# Altium footprint library BaseBoard.PcbLib: 128 footprints (part 3 of 8)
Each footprint in its own frame and in the unit in brackets; x right, y up, seen from the top. Pads: shape width x height; smd on the part's side, far side on the other; paste and mask are expansions set on the pad; w line width, h text height; cw(c..) or ccw(c..) is an arc to the next point about the centre after c.
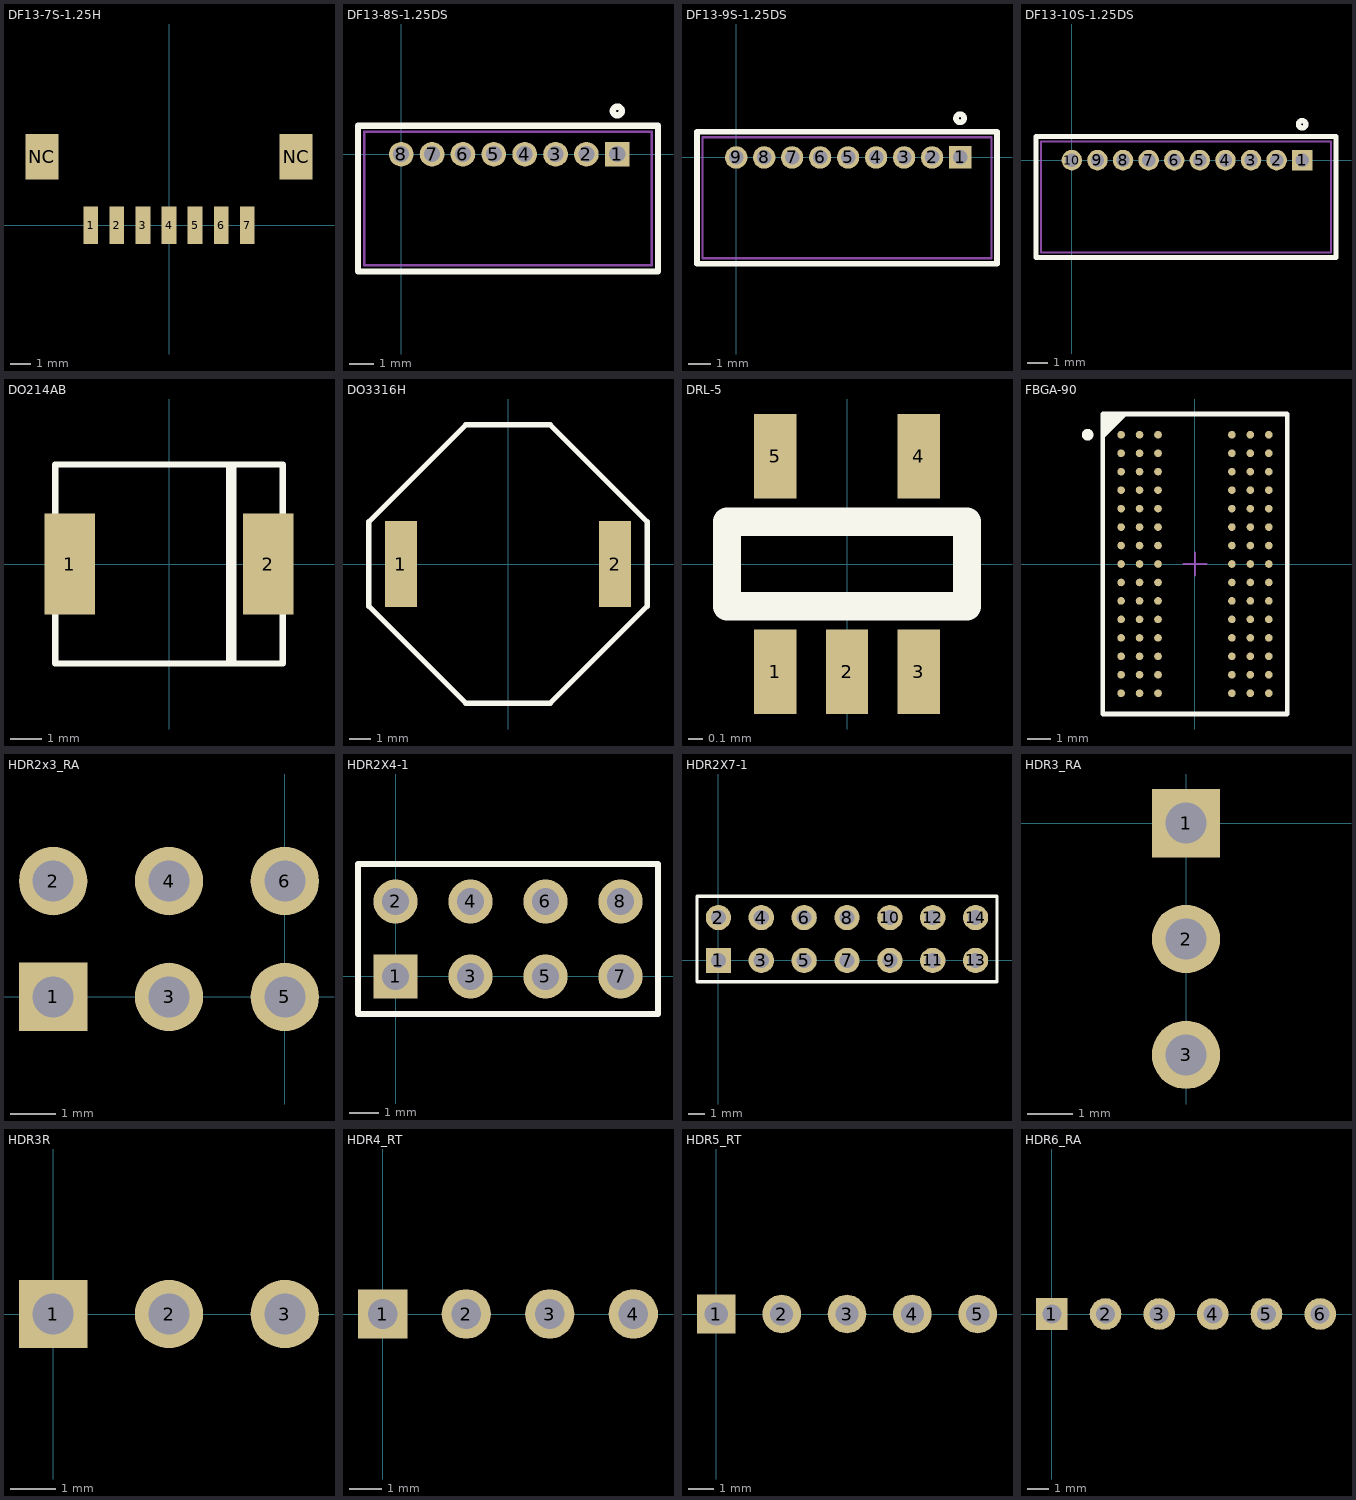
[diagram p2: the footprints below, top view; thin cyan lines are the x and y axes]

## DF13-7S-1.25H [mm] "Hirose Right handle SMD 7pin"
pads (9):
  rect 0.7x1.8 smd: 1(-3.75,0) 2(-2.5,0) 3(-1.25,0) 4(0,0) 5(1.25,0) 6(2.5,0) 7(3.75,0)
  rect 1.6x2.2 smd: NC(-6.1,3.3) NC(6.1,3.3)
3D body "DF13A-7P-1.25H.stp": height 3.58, standoff -0.02, extent -6.7,-0.5 6.7,6

## DF13-8S-1.25DS [mm] "DF13, 8 pin through hole, 1.25 mm"
pads (8):
  rect 1x1 hole 0.65: 1(8.75,0)
  round 1 hole 0.65: 2(7.5,0) 3(6.25,0) 4(5,0) 5(3.75,0) 6(2.5,0) 7(1.25,0) 8(0,0)
Top Overlay:
  circle w0.254: c8.75,1.75 r0.18
  lines w0.254: -1.75,-4.75 -1.75,1.15 10.4,1.15 10.4,-4.75 -1.75,-4.75
Mechanical 13:
  lines w0.1: -1.5,-4.5 10.15,-4.5 10.15,0.9 -1.5,0.9 -1.5,-4.5
3D body: height 3.6, standoff 0, extent -1.55,-4.55 10.2,0.95

## DF13-9S-1.25DS [mm] "DF13, 9pin through hole, 1.25mm"
pads (9):
  rect 1x1 hole 0.65: 1(10,0)
  round 1 hole 0.65: 2(8.75,0) 3(7.5,0) 4(6.25,0) 5(5,0) 6(3.75,0) 7(2.5,0) 8(1.25,0) 9(0,0)
Top Overlay:
  circle w0.254: c10,1.75 r0.18
  lines w0.254: -1.75,-4.75 -1.75,1.15 11.65,1.15 11.65,-4.75 -1.75,-4.75
Mechanical 13:
  lines w0.1: -1.5,-4.5 11.4,-4.5 11.4,0.9 -1.5,0.9 -1.5,-4.5
3D body: height 3.6, standoff 0, extent -1.55,-4.55 11.45,0.95

## DF13-10S-1.25DS [mm] "DF13, 10 pin through hole, right angle"
height 3.6
pads (10):
  rect 1x1 hole 0.65: 1(11.25,0)
  round 1 hole 0.65: 2(10,0) 3(8.75,0) 4(7.5,0) 5(6.25,0) 6(5,0) 7(3.75,0) 8(2.5,0) 9(1.25,0) 10(0,0)
Top Overlay:
  circle w0.254: c11.25,1.75 r0.18
  lines w0.254: -1.75,-4.75 12.9,-4.75 12.9,1.15 -1.75,1.15 -1.75,-4.75
Mechanical 13:
  lines w0.1: -1.5,-4.5 -1.5,0.9 12.65,0.9 12.65,-4.5 -1.5,-4.5
3D body: height 3.6, standoff 0, extent -1.55,-4.55 12.7,0.95

## DO214AB [mm]
height 2.65
pads (2):
  rect 1.6x3.2 smd: 1(-3.15,0) 2(3.15,0)
Top Overlay:
  lines w0.2: 1.905,-3.15 1.905,3.15 ; 2.032,-3.15 2.032,3.15 ; -3.6,-3.15 -3.6,3.15 3.6,3.15 3.6,-3.15 -3.6,-3.15

## DO3316H [mm] "Inductor for power"
pads (2):
  rect 1.52x4.06 smd: 1(-5.08,0) 2(5.08,0)
Top Overlay:
  lines w0.254: -1.9,-6.6 -1.6,-6.6 ; 1.397,-6.6 1.9,-6.6 ; 1.9,6.6 1.6,6.6 ; -1.6,-6.6 -2,-6.6 -6.6,-2 -6.6,2 -2,6.6 -1.9,6.6 -1.6,6.6 1.6,6.6 ; -1.6,-6.6 1.6,-6.6 2,-6.6 6.6,-2 6.6,2 2,6.6 1.6,6.6

## DRL-5 [mm]
pads (5):
  rect 0.3x0.6 smd mask+0.11: 1(-0.508,-0.762) 2(0,-0.762) 3(0.508,-0.762) 4(0.508,0.762) 5(-0.508,0.762)
Top Overlay:
  lines w0.2: -0.85,-0.3 -0.85,0.3 0.85,0.3 0.85,-0.3 -0.85,-0.3

## FBGA-90 [mm] "8 * 13mm, 90-Ball Ball Grid Array Rectangular 0.8 mm Pitch (FB)"
pads (90):
  round 0.33 smd: A1(-3.2,5.6) A2(-2.4,5.6) A3(-1.6,5.6) A7(1.6,5.6) A8(2.4,5.6) A9(3.2,5.6) B1(-3.2,4.8) B2(-2.4,4.8) B3(-1.6,4.8) B7(1.6,4.8) B8(2.4,4.8) B9(3.2,4.8) C1(-3.2,4) C2(-2.4,4) C3(-1.6,4) C7(1.6,4) C8(2.4,4) C9(3.2,4) D1(-3.2,3.2) D2(-2.4,3.2) D3(-1.6,3.2) D7(1.6,3.2) D8(2.4,3.2) D9(3.2,3.2) E1(-3.2,2.4) E2(-2.4,2.4) E3(-1.6,2.4) E7(1.6,2.4) E8(2.4,2.4) E9(3.2,2.4) F1(-3.2,1.6) F2(-2.4,1.6) F3(-1.6,1.6) F7(1.6,1.6) F8(2.4,1.6) F9(3.2,1.6) G1(-3.2,0.8) G2(-2.4,0.8) G3(-1.6,0.8) G7(1.6,0.8) G8(2.4,0.8) G9(3.2,0.8) H1(-3.2,0) H2(-2.4,0) H3(-1.6,0) H7(1.6,0) H8(2.4,0) H9(3.2,0) J1(-3.2,-0.8) J2(-2.4,-0.8) J3(-1.6,-0.8) J7(1.6,-0.8) J8(2.4,-0.8) J9(3.2,-0.8) K1(-3.2,-1.6) K2(-2.4,-1.6) K3(-1.6,-1.6) K7(1.6,-1.6) K8(2.4,-1.6) K9(3.2,-1.6) L1(-3.2,-2.4) L2(-2.4,-2.4) L3(-1.6,-2.4) L7(1.6,-2.4) L8(2.4,-2.4) L9(3.2,-2.4) M1(-3.2,-3.2) M2(-2.4,-3.2) M3(-1.6,-3.2) M7(1.6,-3.2) M8(2.4,-3.2) M9(3.2,-3.2) N1(-3.2,-4) N2(-2.4,-4) N3(-1.6,-4) N7(1.6,-4) N8(2.4,-4) N9(3.2,-4) P1(-3.2,-4.8) P2(-2.4,-4.8) P3(-1.6,-4.8) P7(1.6,-4.8) P8(2.4,-4.8) P9(3.2,-4.8) R1(-3.2,-5.6) R2(-2.4,-5.6) R3(-1.6,-5.6) R7(1.6,-5.6) R8(2.4,-5.6) R9(3.2,-5.6)
Top Overlay:
  circle w0.25: c-4.65,5.6 r0.125
  region: -2.929,6.469 -3.929,5.469 -3.929,6.469
  lines w0.2: -4,-6.5 4,-6.5 4,6.5 -4,6.5 -4,-6.5
Mechanical 13:
  lines w0.1: -4,-6.5 4,-6.5 4,6.5 -4,6.5 -4,-6.5
Mechanical 15:
  lines w0.1: -0.5,0 0.5,0 ; 0,-0.5 0,0.5
3D body: height 1.2, standoff 0, extent -4,-6.5 4,6.5

## HDR2x3_RA [mm] "right angle 3x2 (double) header"
pads (6):
  rect 1.5x1.5 hole 0.9: 1(-5.08,0)
  round 1.5 hole 0.9: 2(-5.08,2.54) 3(-2.54,0) 4(-2.54,2.54) 5(0,0) 6(0,2.54)
3D body "Samtec-TSW-103-08-G-D-RA.step": height 6.04, standoff -1.83, extent -6.355,-9.907 1.265,2.857

## HDR2X4-1 [mm] "Connector; Header; 4x2 Position"
pads (8):
  rect 1.5x1.5 hole 0.9: 1(0,0)
  round 1.5 hole 0.9: 2(0,2.54) 3(2.54,0) 4(2.54,2.54) 5(5.08,0) 6(5.08,2.54) 7(7.62,0) 8(7.62,2.54)
Top Overlay:
  lines w0.2: -1.27,-1.27 8.89,-1.27 8.89,3.81 -1.27,3.81 -1.27,-1.27

## HDR2X7-1 [mm]
pads (14):
  rect 1.5x1.5 hole 0.9: 1(0,0)
  round 1.5 hole 0.9: 2(0,2.54) 3(2.54,0) 4(2.54,2.54) 5(5.08,0) 6(5.08,2.54) 7(7.62,0) 8(7.62,2.54) 9(10.16,0) 10(10.16,2.54) 11(12.7,0) 12(12.7,2.54) 13(15.24,0) 14(15.24,2.54)
Top Overlay:
  lines w0.2: -1.27,-1.27 -1.27,3.81 16.51,3.81 16.51,-1.27 -1.27,-1.27

## HDR3_RA [mm] "3 row right angle header"
pads (3):
  rect 1.5x1.5 hole 0.9: 1(0,0)
  round 1.5 hole 0.9: 2(0,-2.54) 3(0,-5.08)
3D body "Samtec-TSW-101-08-G-T-RA.step": height 8.81, standoff -1.6, extent -1.265,-14.978 1.275,0.325

## HDR3R [mm] "3 pin right angle header 2.54"
pads (3):
  rect 1.5x1.5 hole 0.9: 1(0,0)
  round 1.5 hole 0.9: 2(2.54,0) 3(5.08,0)
3D body "Samtec-TSW-103-08-G-S-RA.step": height 3.27, standoff -2.06, extent -1.275,-9.898 6.345,0.325

## HDR4_RT [mm] "right angle 4 pin header 2.54"
pads (4):
  rect 1.5x1.5 hole 0.9: 1(0,0)
  round 1.5 hole 0.9: 2(2.54,0) 3(5.08,0) 4(7.62,0)
3D body "Samtec-TSW-104-08-G-S-RA.step": height 3.27, standoff -2.06, extent -1.275,-9.899 8.885,0.325

## HDR5_RT [mm] "5pin right angled header"
pads (5):
  rect 1.5x1.5 hole 0.9: 1(0,0)
  round 1.5 hole 0.9: 2(2.54,0) 3(5.08,0) 4(7.62,0) 5(10.16,0)
3D body "Samtec-TSW-105-08-G-S-RA.step": height 3.27, standoff -2.06, extent -1.275,-9.899 11.425,0.325

## HDR6_RA [mm] "Right angled 6 pin header 2.54mm pitch"
pads (6):
  rect 1.5x1.5 hole 0.9: 1(0,0)
  round 1.5 hole 0.9: 2(2.54,0) 3(5.08,0) 4(7.62,0) 5(10.16,0) 6(12.7,0)
3D body "Samtec-TSW-106-08-G-S-RA.step": height 3.27, standoff -2.06, extent -1.275,-9.899 13.965,0.325